# Altium footprint library 定位手表.PcbLib: 35 footprints (part 3 of 3)
Each footprint in its own frame and in the unit in brackets; x right, y up, seen from the top. Pads: shape width x height; smd on the part's side, far side on the other; paste and mask are expansions set on the pad; w line width, h text height; cw(c..) or ccw(c..) is an arc to the next point about the centre after c.
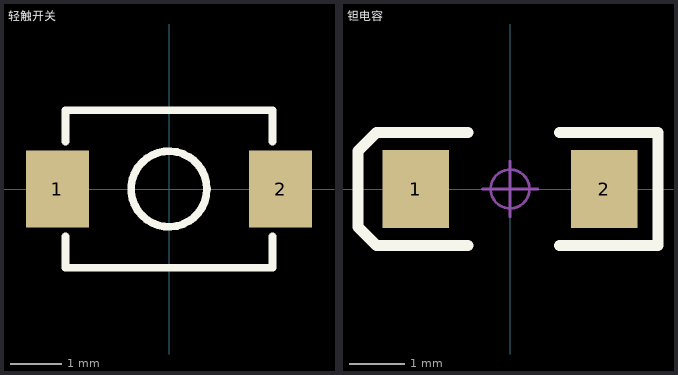
[diagram p2: the footprints below, top view; thin cyan lines are the x and y axes]

## 轻触开关 [mm]
pads (2):
  rect 1.23x1.5 smd: 1(-2.185,0) 2(2.185,0)
Top Overlay:
  circle w0.152: c0,0 r0.741
  lines w0.152: -2.026,-0.93 -2.026,-1.541 2.026,-1.541 2.026,-0.93 ; -2.026,0.93 -2.026,1.541 2.026,1.541 2.026,0.93
3D body "key.step": height 2.01, standoff 0.01, extent -2.499,-1.476 2.499,1.473

## 选装编码器 [mm]

## 钽电容 [mm] "长3.2mm，宽1.6mm，厚1.6mm"
pads (2):
  rect 1.2x1.4 smd: 1(-1.7,0) 2(1.7,0)
Top Overlay:
  lines w0.2: -0.762,-1.016 -2.413,-1.016 -2.743,-0.686 -2.743,0.686 -2.413,1.016 -0.762,1.016 ; 0.889,-1.016 2.667,-1.016 2.667,1.016 0.889,1.016
Mechanical 15:
  circle w0.05: c0,0 r0.35
  lines w0.05: -0.5,0 0.5,0 ; 0,-0.5 0,0.5
3D body "cd_a_3216__-2 asm.STEP": height 1.63, standoff 0.03, extent -1.6,-0.8 1.6,0.8